# Altium footprint library ParsaLibrary.PcbLib: 526 footprints (part 1 of 33)
Each footprint in its own frame and in the unit in brackets; x right, y up, seen from the top. Pads: shape width x height; smd on the part's side, far side on the other; paste and mask are expansions set on the pad; w line width, h text height; cw(c..) or ccw(c..) is an arc to the next point about the centre after c.
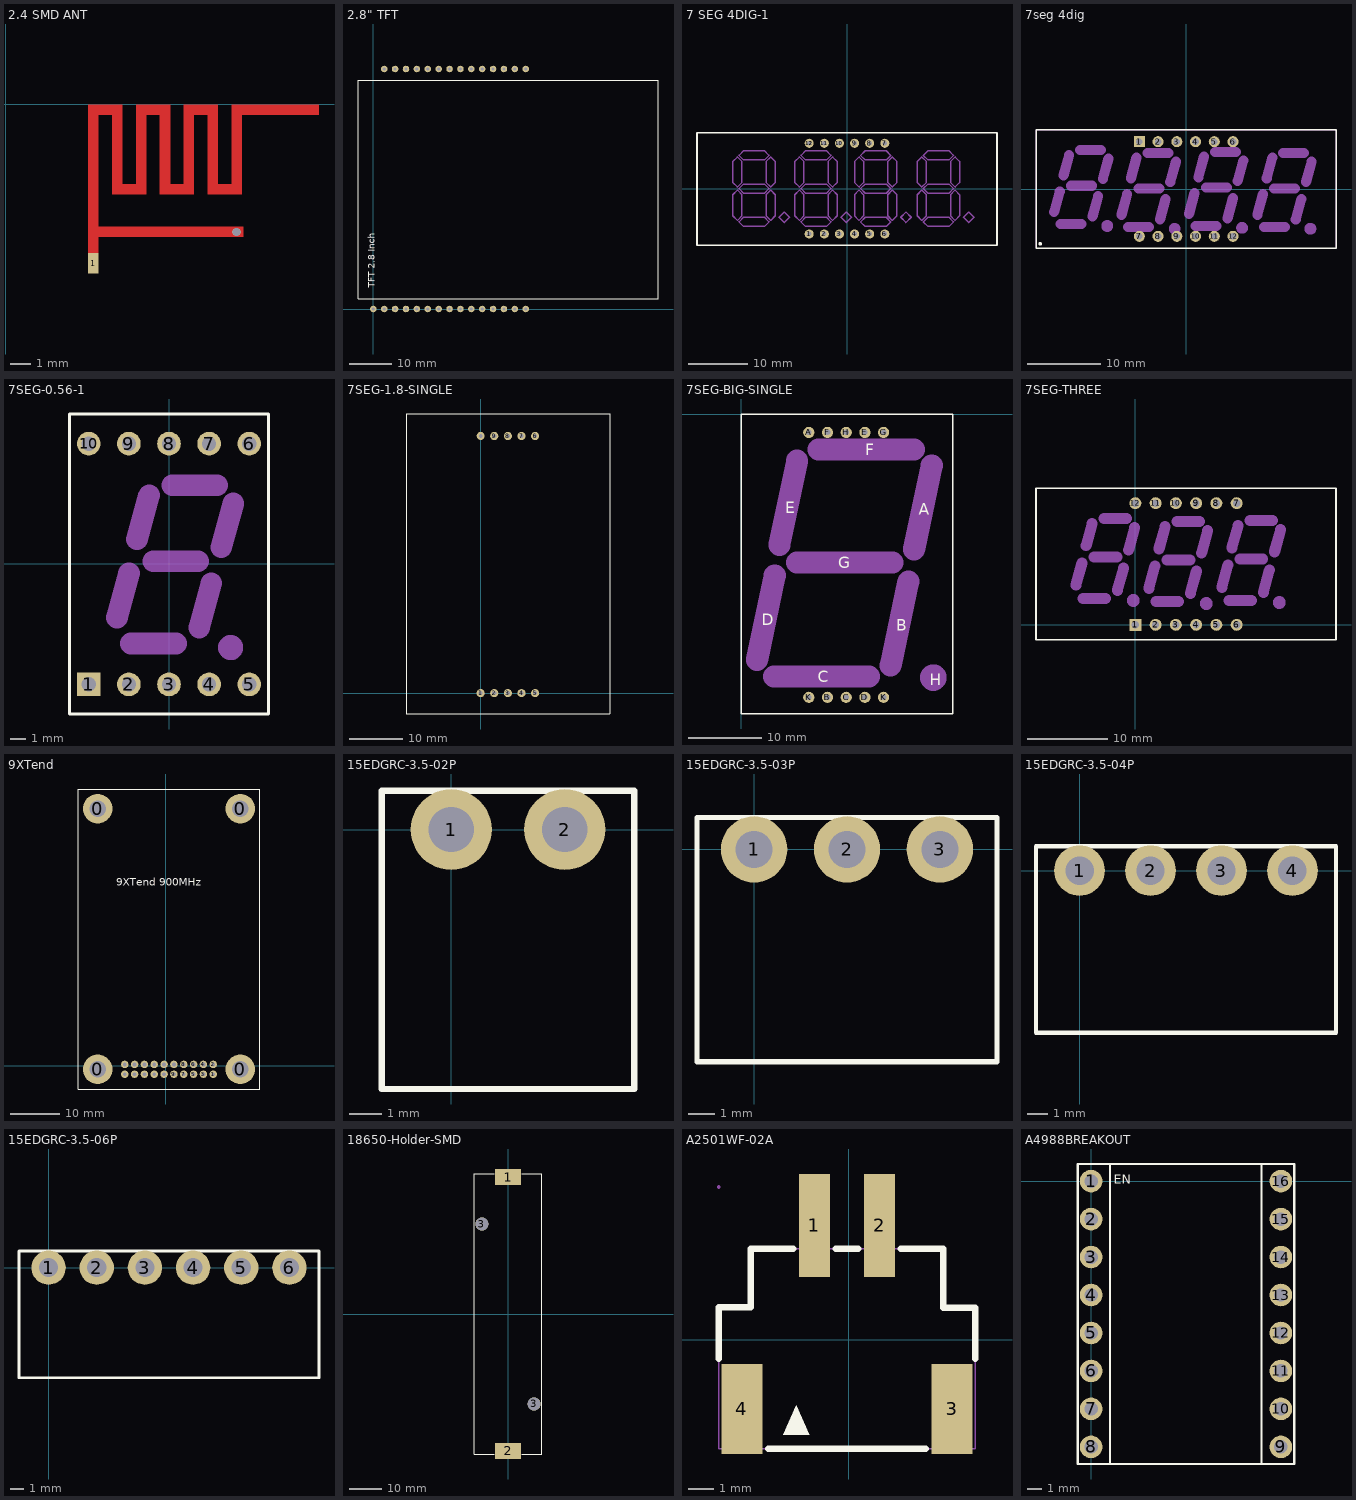
[diagram p0: the footprints below, top view; thin cyan lines are the x and y axes]

## 2.4 SMD ANT [mm]
pads (1):
  rect 0.508x1 smd: 1(4.191,-7.6)
via 11.049,-6.096 diameter 0.381 hole 0.381
Top Layer:
  rectangle: 4.445,-6.35 11.379,-5.842
  region: 4.445,-7.112 4.445,0 3.937,0 3.937,-7.112
  rectangle: 3.937,-0.508 5.588,0
  region: 5.08,-0.508 5.08,-4.318 5.588,-4.318 5.588,-0.508
  rectangle: 5.08,-4.318 6.731,-3.81
  region: 6.223,-0.508 6.223,-4.318 6.731,-4.318 6.731,-0.508
  region: 8.509,-0.508 8.509,-4.318 9.017,-4.318 9.017,-0.508
  rectangle: 7.366,-4.318 9.017,-3.81
  region: 7.366,-0.508 7.366,-4.318 7.874,-4.318 7.874,-0.508
  rectangle: 6.223,-0.508 7.874,0
  region: 10.795,-0.508 10.795,-4.318 11.303,-4.318 11.303,-0.508
  rectangle: 9.652,-4.318 11.303,-3.81
  region: 9.652,-0.508 9.652,-4.318 10.16,-4.318 10.16,-0.508
  rectangle: 8.509,-0.508 10.16,0
  rectangle: 10.795,-0.508 14.986,0

## 2.8" TFT [mil] "ECA TFT LCD"
pads (29):
  round 60 hole 30: 1(1300,0) 2(1400,0) 3(1100,0) 4(1200,0) 5(1000,0) 6(0,0) 7(800,0) 8(900,0) 9(600,0) 10(700,0) 11(400,0) 12(500,0) 13(200,0) 14(300,0) 15(100,2204.72) 16(100,0) 17(300,2204.72) 18(200,2204.72) 19(500,2204.72) 20(400,2204.72) 21(700,2204.72) 22(600,2204.72) 23(900,2204.72) 24(800,2204.72) 25(1100,2204.72) 26(1000,2204.72) 27(1200,2204.72) 29(1400,2204.72) 30(1300,2204.72)
Top Overlay:
  lines w10: -140.91,95 2615,95 2615,2102.87 -140.91,2102.87 -140.91,95
  text "TFT 2.8 Inch" at 15,195 h60

## 7 SEG 4DIG-1 [mil]
pads (13):
  round 60 hole 30: 1(-250,-300) 2(-150,-300) 3(-50,-300) 4(50,-300) 5(150,-300) 6(250,-300) 7(250,300) 8(150,300) 9(50,300) 10(-50,300) 11(-150,300) 12(-250,300) 12(-250,300)
Top Overlay:
  lines w10: -992.13,-374.02 -992.13,369.02 992.13,369.02 992.13,-374.02 -992.13,-374.02
Mechanical 1:
  drawing of 184 lines, arcs and shapes, not listed
  text "A" at -630,200 h39.37
  text "C" at -520,-135 h39.37
  text "D" at -625,-240 h39.37
  text "E" at -740,-135 h39.37
  text "F" at -735,85 h39.37
  text "B" at -520,85 h39.37
  text "G" at -630,-20 h39.37
  text "H" at -430,-210 h39.37
  text "H" at -20,-210 h39.37
  text "G" at -220,-20 h39.37
  text "B" at -110,85 h39.37
  text "F" at -325,85 h39.37
  text "E" at -330,-135 h39.37
  text "D" at -215,-240 h39.37
  text "C" at -110,-135 h39.37
  text "A" at -220,200 h39.37
  text "H" at 375,-210 h39.37
  text "G" at 175,-20 h39.37
  text "B" at 285,85 h39.37
  text "F" at 70,85 h39.37
  text "E" at 65,-135 h39.37
  text "D" at 180,-240 h39.37
  text "C" at 285,-135 h39.37
  text "A" at 175,200 h39.37
  text "H" at 790,-210 h39.37
  text "G" at 590,-20 h39.37
  text "B" at 700,85 h39.37
  text "F" at 485,85 h39.37
  text "E" at 480,-135 h39.37
  text "D" at 595,-240 h39.37
  text "C" at 700,-135 h39.37
  text "A" at 590,200 h39.37
3D body "4-Digit 7-Segment LED Display - Multiplexed.stp": height 330.45, standoff -264.04, extent -983.49,-374.01 985.03,374.02

## 7seg 4dig [mm]
pads (12):
  rect 1.5x1.5 hole 0.9: 1(-6.35,6.413)
  round 1.5 hole 0.9: 2(-3.81,6.413) 3(-1.27,6.413) 4(1.27,6.413) 5(3.81,6.413) 6(6.35,6.413) 7(-6.35,-6.413) 8(-3.81,-6.413) 9(-1.27,-6.413) 10(1.27,-6.413) 11(3.81,-6.413) 12(6.35,-6.413)
Top Overlay:
  circle w0.25: c-19.81,-7.429 r0.125
  lines w0.2: -20.37,-8.064 20.32,-8.064 20.32,8.064 -20.37,8.064 -20.37,-8.064
Mechanical 1:
  circle w1: c-10.71,-5.016 r0.296
  circle w1: c-1.566,-5.397 r0.296
  circle w1: c7.578,-5.271 r0.296
  circle w1: c16.849,-5.397 r0.296
  lines w1.37: -17.907,-3.111 -17.145,-0.318 ; -17.018,-4.763 -14.174,-4.763 ; -16.637,1.841 -15.875,4.635 ; -15.621,0.445 -12.777,0.445 ; -14.401,5.271 -11.557,5.271 ; -12.7,-3.746 -11.938,-0.953 ; -11.303,1.333 -10.541,4.127 ; -8.763,-3.492 -8.001,-0.699 ; -7.874,-5.143 -5.03,-5.143 ; -7.493,1.46 -6.731,4.255 ; -6.477,0.064 -3.633,0.064 ; -5.257,4.889 -2.413,4.889 ; -3.556,-4.127 -2.794,-1.333 ; -2.159,0.953 -1.397,3.746 ; 0.381,-3.365 1.143,-0.572 ; 1.27,-5.016 4.114,-5.016 ; 1.651,1.587 2.413,4.381 ; 2.667,0.191 5.511,0.191 ; 3.887,5.016 6.731,5.016 ; 5.588,-4 6.35,-1.206 ; 6.985,1.079 7.747,3.873 ; 9.652,-3.492 10.414,-0.699 ; 10.541,-5.143 13.385,-5.143 ; 10.922,1.46 11.684,4.255 ; 11.938,0.064 14.782,0.064 ; 13.158,4.889 16.002,4.889 ; 14.859,-4.127 15.621,-1.333 ; 16.256,0.953 17.018,3.746
Mechanical 13:
  lines w0.1: -20.37,-8.064 -20.37,8.064 20.32,8.064 20.32,-8.064 -20.37,-8.064
3D body: height 8.25, standoff 0, extent -20.32,-8.064 20.32,8.064

## 7SEG-0.56-1 [mm]
pads (10):
  rect 1.5x1.5 hole 0.9: 1(-5.08,-7.62)
  round 1.5 hole 0.9: 2(-2.54,-7.62) 3(0,-7.62) 4(2.54,-7.62) 5(5.08,-7.62) 6(5.08,7.62) 7(2.54,7.62) 8(0,7.62) 9(-2.54,7.62) 10(-5.08,7.62)
Top Overlay:
  lines w0.2: -6.3,-9.5 6.3,-9.5 6.3,9.5 -6.3,9.5 -6.3,-9.5
Mechanical 1:
  circle w1: c3.904,-5.291 r0.296
  lines w1.37: -3.293,-3.386 -2.531,-0.592 ; -2.404,-5.037 0.44,-5.037 ; -2.023,1.567 -1.261,4.361 ; -1.007,0.17 1.837,0.17 ; 0.213,4.996 3.057,4.996 ; 1.914,-4.021 2.676,-1.227 ; 3.311,1.059 4.073,3.853
Mechanical 13:
  lines w0.1: -6.3,9.5 6.3,9.5
3D body "User Library-7-Segment.step": height 8, standoff -6.3, extent -6.3,-9.5 6.3,9.5

## 7SEG-1.8-SINGLE [mil]
pads (10):
  round 60 hole 30: 1(0,0) 2(100,0) 3(200,0) 4(300,0) 5(400,0) 6(400,1889.29) 7(300,1889.29) 8(200,1889.29) 9(100,1889.29)
  round 59.06 hole 27.56: 10(0,1889.76)
Top Overlay:
  lines w7.87: -547.24,-153.54 948.82,-153.54 948.82,2051.18 -547.24,2051.18 -547.24,-153.54
3D body "User Library-7-Segment-1_8Inch.step": height 433.07, standoff -157.48, extent -547.24,-153.54 948.83,2051.19

## 7SEG-BIG-SINGLE [mil] "big 7segment"
height 354.33
pads (10):
  round 60 hole 30: A(362.2,-98.43) B(462.2,-1515.75) C(562.2,-1515.75) D(662.2,-1515.75) E(662.2,-98.43) F(462.2,-98.43) G(762.2,-98.43) H(562.2,-98.43) K(362.2,-1515.75) K(762.2,-1515.75)
Top Overlay:
  lines w7.87: 0,-1605 1133.07,-1605 1133.07,0 0,0 0,-1605
  text "H" at 1010,-1450 h60
  text "G" at 520,-825 h60
  text "F" at 665,-220 h60
  text "E" at 235,-530 h60
  text "D" at 110,-1130 h60
  text "C" at 410,-1435 h60
  text "B" at 830,-1160 h60
  text "A" at 950,-540 h60
Mechanical 1:
  circle w118.11: c1028.35,-1410 r11.65
  lines w118.11: 85,-1315 180,-865 ; 175,-1405 685,-1405 ; 205,-700 300,-250 ; 300,-795 810,-795 ; 415,-190 925,-190 ; 800,-1345 895,-895 ; 925,-725 1020,-275

## 7SEG-THREE [mm]
pads (12):
  rect 1.5x1.5 hole 0.9: 1(0,0)
  round 1.5 hole 0.9: 2(2.54,0) 3(5.08,0) 4(7.62,0) 5(10.16,0) 6(12.7,0) 7(12.7,15.24) 8(10.16,15.24) 9(7.62,15.24) 10(5.08,15.24) 11(2.54,15.24) 12(0,15.24)
Top Overlay:
  lines w0.2: -12.45,-1.88 -12.45,17.12 25.15,17.12 25.15,-1.88 -12.45,-1.88
Mechanical 13:
  circle w1: c18.038,2.794 r0.296
  circle w1: c8.894,2.667 r0.296
  circle w1: c-0.25,3.048 r0.296
  lines w1.37: -7.447,4.953 -6.685,7.747 ; -6.558,3.302 -3.714,3.302 ; -6.177,9.906 -5.415,12.7 ; -5.161,8.509 -2.317,8.509 ; -3.941,13.335 -1.097,13.335 ; -2.24,4.318 -1.478,7.112 ; -0.843,9.398 -0.081,12.192 ; 1.697,4.572 2.459,7.366 ; 2.586,2.921 5.43,2.921 ; 2.967,9.525 3.729,12.319 ; 3.983,8.128 6.827,8.128 ; 5.203,12.954 8.047,12.954 ; 6.904,3.937 7.666,6.731 ; 8.301,9.017 9.063,11.811 ; 10.841,4.699 11.603,7.493 ; 11.73,3.048 14.574,3.048 ; 12.111,9.652 12.873,12.446 ; 13.127,8.255 15.971,8.255 ; 14.347,13.081 17.191,13.081 ; 16.048,4.064 16.81,6.858 ; 17.445,9.144 18.207,11.938
3D body "User Library-5631_w_o_color_jam.SLDPRT": height 8.1, standoff -5.5, extent -12.4,-1.8 25.2,17.2

## 9XTend [mil] "9XTend 900MHz RF Module"
height 196.85
pads (24):
  round 236.22 hole 129.92: 0(-545.2,-30) 0(-545.2,2056.61) 0(596.54,-30) 0(596.54,2056.61)
  round 60 hole 30: 1(380,-69.37) 2(380,9.37) 3(301.26,-69.37) 4(301.26,9.37) 5(222.52,-69.37) 6(222.52,9.37) 7(143.78,-69.37) 8(143.78,9.37) 9(65.04,-69.37) 10(65.04,9.37) 11(-13.7,-69.37) 12(-13.7,9.37) 13(-92.44,-69.37) 14(-92.44,9.37) 15(-171.18,-69.37) 16(-171.18,9.37) 17(-249.92,-69.37) 18(-249.92,9.37) 19(-328.66,-69.37) 20(-328.66,9.37)
Top Overlay:
  lines w10: -702.68,-187.48 754.02,-187.48 754.02,2214.09 -702.68,2214.09 -702.68,-187.48
  text "9XTend 900MHz" at -395,1440 h60

## 15EDGRC-3.5-02P [mm]
height 7.24
pads (2):
  round 2.5 hole 1.4: 1(0,0) 2(3.5,0)
Top Overlay:
  lines w0.2: -2.15,-8 -2.15,1.2 5.65,1.2 5.65,-8 -2.15,-8
3D body "15EDGRC-3.5-02P-1Y-00A&Z(H).stp": height 7.29, standoff -3.35, extent -2.15,-8 5.65,1.2

## 15EDGRC-3.5-03P [mm]
height 7.24
pads (3):
  round 2.5 hole 1.4: 1(0,0) 2(3.5,0) 3(7,0)
Top Overlay:
  lines w0.2: -2.15,-8 9.15,-8 9.15,1.2 -2.15,1.2 -2.15,-8
3D body "15EDGRC-3.5-03P-1Y-00A&Z(H).stp": height 7.29, standoff -3.35, extent -2.15,-8 9.15,1.2

## 15EDGRC-3.5-04P [mm]
height 7.24
pads (4):
  round 2.5 hole 1.4: 1(0,0) 2(3.5,0) 3(7,0) 4(10.5,0)
Top Overlay:
  lines w0.2: -2.15,-8 -2.15,1.2 12.65,1.2 12.65,-8 -2.15,-8
3D body "15EDGRC-3.5-04P-1Y-00A&Z(H).stp": height 7.29, standoff -3.35, extent -2.15,-8 12.65,1.2

## 15EDGRC-3.5-06P [mm]
height 7.24
pads (6):
  round 2.5 hole 1.4: 1(0,0) 2(3.5,0) 3(7,0) 4(10.5,0) 5(14,0) 6(17.5,0)
Top Overlay:
  lines w0.2: -2.15,-8 -2.15,1.2 19.65,1.2 19.65,-8 -2.15,-8
3D body "15EDGRC-3.5-06P-1Y-00A&Z(H).stp": height 7.29, standoff -3.35, extent -2.15,-8 19.65,1.2

## 18650-Holder-SMD [mm]
pads (4):
  rect 8x5 smd: 1(0,42) 2(0,-42)
  round 4 hole 4: 3(-8.007,27.592) 3(8.007,-27.592)
Top Overlay:
  lines w0.254: -4.184,-43.013 -10.331,-43.013 -10.331,43.007 -4.15,43.007 ; 4.15,43.007 10.331,43.007 10.331,-43.013 4.184,-43.013
3D body "User Library-KEYELCO_1042.step": height 14.86, standoff -3.43, extent -10.325,-43.027 10.325,42.977

## A2501WF-02A [mm]
pads (4):
  rect 1.2x4 smd: 1(-1.334,4.462) 2(1.206,4.462)
  rect 1.6x3.5 smd: 3(4.036,-2.692) 4(-4.164,-2.692)
Top Overlay:
  region: -2.554,-3.692 -1.665,-3.692 -1.538,-3.692 -2.046,-2.549
  lines w0.254: -5.065,-0.734 -5.065,1.268 -3.813,1.268 -3.813,3.559 -2.164,3.559 ; -3.133,-4.242 3.005,-4.242 ; -0.503,3.558 0.375,3.558 ; 2.037,3.558 3.686,3.558 3.686,1.258 4.936,1.258 4.936,-0.734
Top 3D Body:
  circle w0.4: c-1.384,5.448 r0.2
Mechanical 15:
  region: -4.364,-1.838 -3.964,-1.838 -3.964,-4.238 -4.364,-4.238
  region: 3.836,-1.838 4.236,-1.838 4.236,-4.238 3.836,-4.238
  region: -1.654,5.962 -1.014,5.962 -1.014,2.533 -1.654,2.533
  region: 0.886,5.962 1.526,5.962 1.526,2.533 0.886,2.533
  region: -5.004,5.962 -5.004,5.937 -5.039,5.902 -5.089,5.902 -5.124,5.937 -5.124,5.962 -5.124,5.987 -5.089,6.022 -5.039,6.022 -5.004,5.987
  lines w0.051: -5.064,-4.238 4.936,-4.238 4.936,1.262 3.686,1.262 3.686,3.562 -3.814,3.562 -3.814,1.262 -5.064,1.262 -5.064,-4.238
3D body "2.54-2P WT.STEP": height 6.1, standoff 0, extent -5.056,-4.556 4.944,5.744

## A4988BREAKOUT [mm]
pads (16):
  round 1.51 hole 0.9: 1(0,0) 2(0,-2.54) 3(0,-5.08) 4(0,-7.62) 5(0,-10.16) 6(0,-12.7) 7(0,-15.24) 8(0,-17.78) 9(12.7,-17.78) 10(12.7,-15.24) 11(12.7,-12.7) 12(12.7,-10.16) 13(12.7,-7.62) 14(12.7,-5.08) 15(12.7,-2.54) 16(12.7,0)
Top Overlay:
  lines w0.15: 1.27,-18.898 1.27,1.143 ; 11.405,-18.923 11.405,1.143
  lines w0.152: -0.889,-18.923 -0.889,1.143 1.27,1.143 11.405,1.143 13.589,1.143 13.589,-18.923 -0.889,-18.923
  text "EN" at 1.524,-0.183 h0.61
3D body "User Library-Mendel 90 - stepstick A4998.step": height 10.62, standoff -0.78, extent -1.258,-19.027 13.984,1.293